# Altium footprint library 769BI_LTDC.PcbLib: 51 footprints (part 1 of 4)
Each footprint in its own frame and in the unit in brackets; x right, y up, seen from the top. Pads: shape width x height; smd on the part's side, far side on the other; paste and mask are expansions set on the pad; w line width, h text height; cw(c..) or ccw(c..) is an arc to the next point about the centre after c.
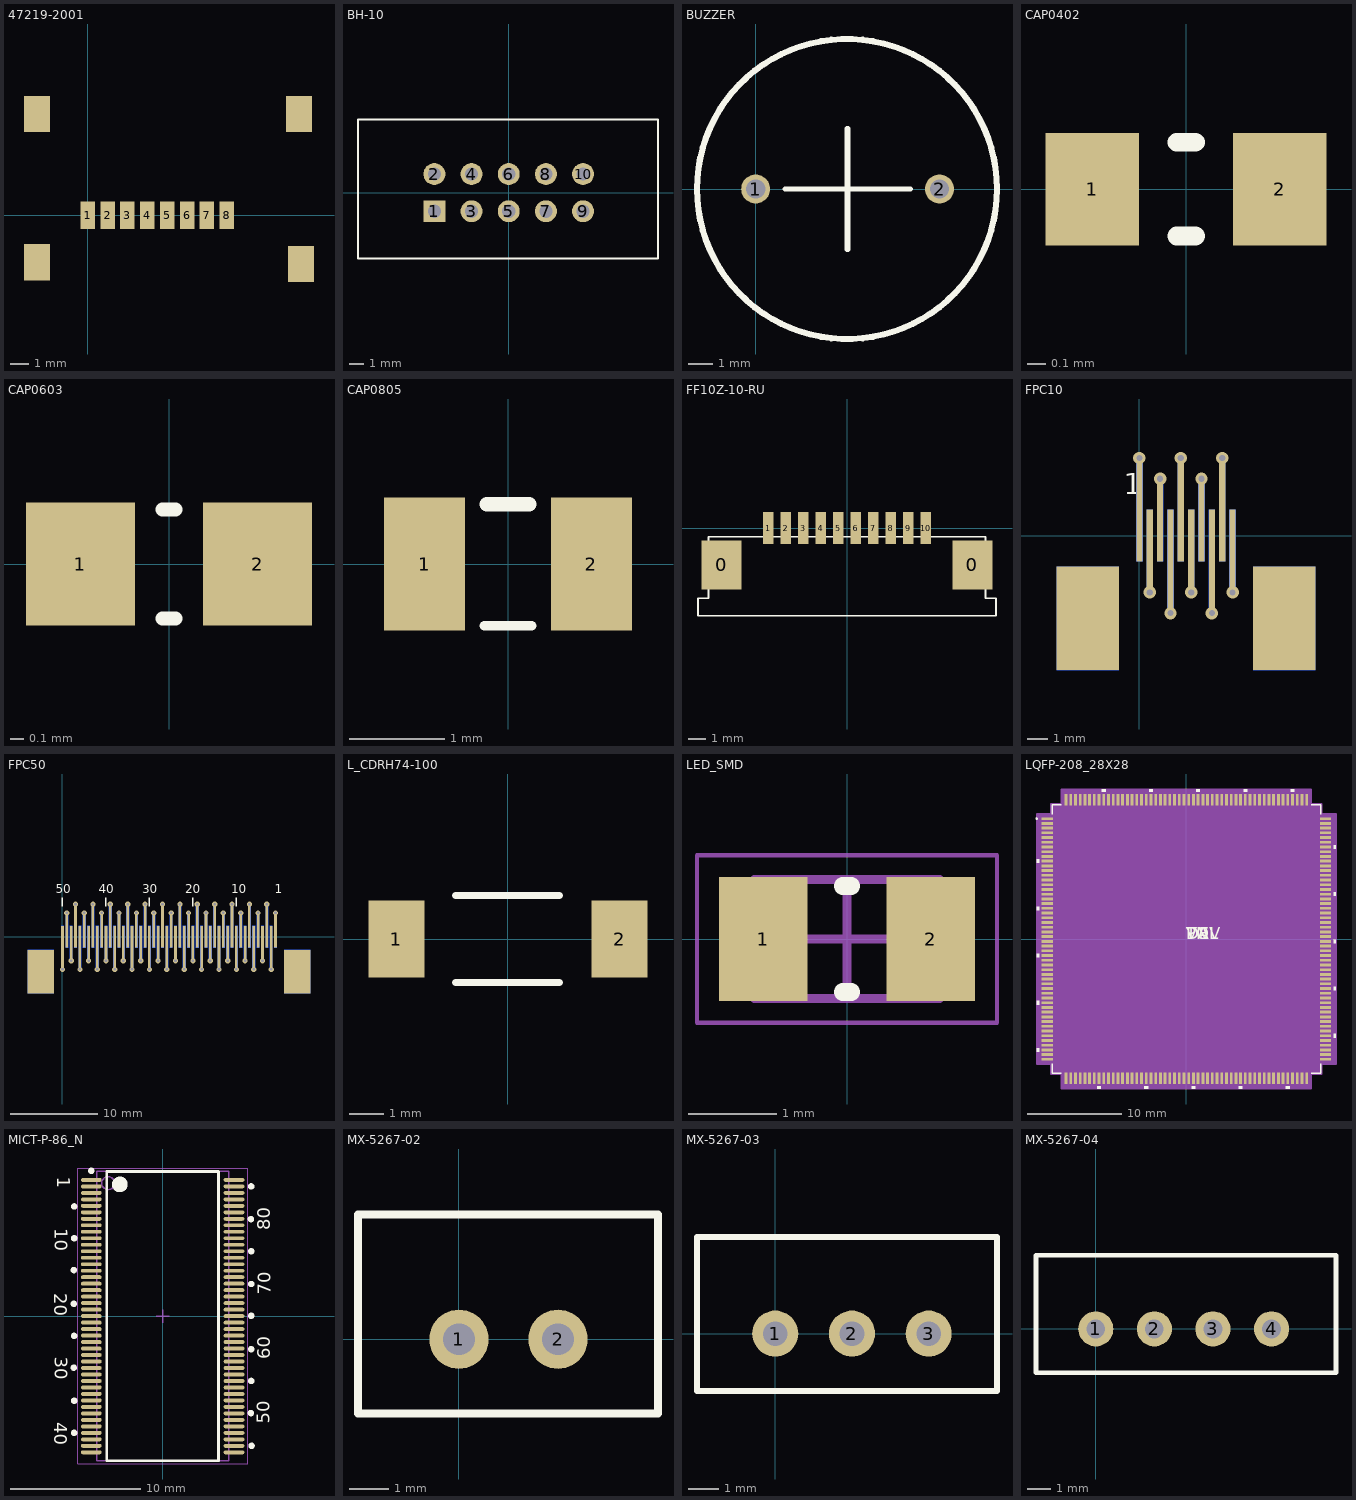
[diagram p0: the footprints below, top view; thin cyan lines are the x and y axes]

## 47219-2001 [mm]
pads (12):
  rect 0.8x1.5 smd: 1(0,0) 2(1.1,0) 3(2.2,0) 4(3.3,0) 5(4.4,0) 6(5.5,0) 7(6.6,0) 8(7.7,0)
  rect 1.45x2 smd: ""(-2.8,-2.6) ""(-2.8,5.6) ""(11.7,5.6) ""(11.8,-2.7)
3D body "472192001.stp": height 2.06, standoff 0.17, extent -2.8,-5.15 11.8,9.35

## BH-10 [mm]
pads (10):
  rect 1.5x1.5 hole 0.9: 1(-5.08,-1.27)
  round 1.5 hole 0.9: 2(-5.08,1.27) 3(-2.54,-1.27) 4(-2.54,1.27) 5(0,-1.27) 6(0,1.27) 7(2.54,-1.27) 8(2.54,1.27) 9(5.08,-1.27) 10(5.08,1.27)
Top Overlay:
  lines w0.127: -10.3,-4.5 -10.3,5 10.2,5 10.2,-4.5 -10.3,-4.5
3D body "BH-10.STEP": height 9.1, standoff -3, extent -10.25,-4.4 10.25,4.9

## BUZZER [mm]
pads (2):
  round 1.2 hole 0.8: 1(0,0) 2(7.6,0)
Top Overlay:
  circle w0.254: c3.775,0 r6.2
  lines w0.2: 1.2,0 3.775,0 ; 3.825,0 6.4,0 ; 3.775,0 3.775,-2.5 3.825,-2.5 3.825,2.5 3.775,2.5 3.775,0
3D body "buzzer.STEP": height 9.5, standoff -5.5, extent -2.317,-6 9.683,6

## CAP0402 [mm] "Capacitor 0402 reflow soldering"
pads (2):
  rect 0.5x0.6 smd: 1(-0.5,0) 2(0.5,0)
Top Overlay:
  lines w0.1: -0.05,-0.25 0.05,-0.25 ; -0.05,0.25 0.05,0.25
3D body "CAP0402.stp": height 0.2, standoff 0, extent -0.5,-0.3 0.5,0.3

## CAP0603 [mm] "capacitor 0603 reflow soldering"
pads (2):
  rect 0.8x0.9 smd: 1(-0.65,0) 2(0.65,0)
Top Overlay:
  lines w0.1: -0.05,-0.4 0.05,-0.4 ; -0.05,0.4 0.05,0.4
3D body "CAP0603.stp": height 0.3, standoff 0, extent -0.8,-0.4 0.8,0.4

## CAP0805 [mm] "capacitor 0805 reflow soldering"
pads (2):
  rect 0.85x1.4 smd: 1(-0.875,0) 2(0.875,0)
Top Overlay:
  lines w0.1: -0.25,-0.65 0.25,-0.65
  lines w0.152: -0.225,0.625 0.225,0.625
3D body "CAP0805.stp": height 0.78, standoff 0, extent -1,-0.625 1,0.625

## FF10Z-10-RU [mm]
pads (12):
  rect 2.3x2.8 smd: 0(-7.15,-2.1) 0(7.15,-2.1)
  rect 0.6x1.8 smd: 1(-4.5,0) 2(-3.5,0) 3(-2.5,0) 4(-1.5,0) 5(-0.5,0) 6(0.5,0) 7(1.5,0) 8(2.5,0) 9(3.5,0) 10(4.5,0)
Top Overlay:
  lines w0.1: -8.5,-5 -8.5,-4 -7.9,-4 -7.9,-0.5 7.9,-0.5 7.9,-4 8.5,-4 8.5,-5 -8.5,-5

## FPC10 [mm]
pads (24):
  rect 0.3x5 smd: 1(0,1.25) 4(1.5,-1.25) 5(2,1.25) 8(3.5,-1.25) 9(4,1.25)
  rect 0.3x5 smd far side: 1(0,1.25) 4(1.5,-1.25) 5(2,1.25) 8(3.5,-1.25) 9(4,1.25)
  rect 0.3x4 smd: 2(0.5,-0.75) 3(1,0.75) 6(2.5,-0.75) 7(3,0.75) 10(4.5,-0.75)
  rect 0.3x4 smd far side: 2(0.5,-0.75) 3(1,0.75) 6(2.5,-0.75) 7(3,0.75) 10(4.5,-0.75)
  rect 3x5 smd: ""(-2.5,-4) ""(7,-4)
  rect 3x5 smd far side: ""(-2.5,-4) ""(7,-4)
via 2.5,-2.75 diameter 0.6 hole 0.3
via 3,2.75 diameter 0.6 hole 0.3
via 4.5,-2.75 diameter 0.6 hole 0.3
via 4,3.75 diameter 0.6 hole 0.3
via 1.5,-3.75 diameter 0.6 hole 0.3
via 3.5,-3.75 diameter 0.6 hole 0.3
via 2,3.75 diameter 0.6 hole 0.3
via 1,2.75 diameter 0.6 hole 0.3
via 0,3.75 diameter 0.6 hole 0.3
via 0.5,-2.75 diameter 0.6 hole 0.3
Top Layer:
  lines w0.3: 2,3.75 2,3.75 ; 3.5,-3.75 3.5,-3.75 ; 4,3.75 4,3.75
Top Overlay:
  text "1" at -0.75,2 h1
3D body "FPC_10.SLDPRT": height 1, standoff -1.05, extent -2.715,-6.51 7.715,-1.4

## FPC50 [mm]
pads (104):
  rect 0.3x4 smd: 1(24.5,0.75) 4(23,-0.75) 5(22.5,0.75) 8(21,-0.75) 9(20.5,0.75) 12(19,-0.75) 13(18.5,0.75) 16(17,-0.75) 17(16.5,0.75) 20(15,-0.75) 21(14.5,0.75) 24(13,-0.75) 25(12.5,0.75) 28(11,-0.75) 29(10.5,0.75) 32(9,-0.75) 33(8.5,0.75) 36(7,-0.75) 37(6.5,0.75) 40(5,-0.75) 41(4.5,0.75) 44(3,-0.75) 45(2.5,0.75) 48(1,-0.75) 49(0.5,0.75)
  rect 0.3x4 smd far side: 1(24.5,0.75) 4(23,-0.75) 5(22.5,0.75) 8(21,-0.75) 9(20.5,0.75) 12(19,-0.75) 13(18.5,0.75) 16(17,-0.75) 17(16.5,0.75) 20(15,-0.75) 21(14.5,0.75) 24(13,-0.75) 25(12.5,0.75) 28(11,-0.75) 29(10.5,0.75) 32(9,-0.75) 33(8.5,0.75) 36(7,-0.75) 37(6.5,0.75) 40(5,-0.75) 41(4.5,0.75) 44(3,-0.75) 45(2.5,0.75) 48(1,-0.75) 49(0.5,0.75)
  rect 0.3x5 smd: 2(24,-1.25) 3(23.5,1.25) 6(22,-1.25) 7(21.5,1.25) 10(20,-1.25) 11(19.5,1.25) 14(18,-1.25) 15(17.5,1.25) 18(16,-1.25) 19(15.5,1.25) 22(14,-1.25) 23(13.5,1.25) 26(12,-1.25) 27(11.5,1.25) 30(10,-1.25) 31(9.5,1.25) 34(8,-1.25) 35(7.5,1.25) 38(6,-1.25) 39(5.5,1.25) 42(4,-1.25) 43(3.5,1.25) 46(2,-1.25) 47(1.5,1.25) 50(0,-1.25)
  rect 0.3x5 smd far side: 2(24,-1.25) 3(23.5,1.25) 6(22,-1.25) 7(21.5,1.25) 10(20,-1.25) 11(19.5,1.25) 14(18,-1.25) 15(17.5,1.25) 18(16,-1.25) 19(15.5,1.25) 22(14,-1.25) 23(13.5,1.25) 26(12,-1.25) 27(11.5,1.25) 30(10,-1.25) 31(9.5,1.25) 34(8,-1.25) 35(7.5,1.25) 38(6,-1.25) 39(5.5,1.25) 42(4,-1.25) 43(3.5,1.25) 46(2,-1.25) 47(1.5,1.25) 50(0,-1.25)
  rect 3x5 smd: ""(-2.5,-4) ""(27,-4)
  rect 3x5 smd far side: ""(-2.5,-4) ""(27,-4)
via 0.5,2.75 diameter 0.6 hole 0.3
via 2.5,2.75 diameter 0.6 hole 0.3
via 4.5,2.75 diameter 0.6 hole 0.3
via 23.5,3.75 diameter 0.6 hole 0.3
via 24,-3.75 diameter 0.6 hole 0.3
via 24.5,2.75 diameter 0.6 hole 0.3
via 21.5,3.75 diameter 0.6 hole 0.3
via 19.5,3.75 diameter 0.6 hole 0.3
via 17.5,3.75 diameter 0.6 hole 0.3
via 15.5,3.75 diameter 0.6 hole 0.3
via 13.5,3.75 diameter 0.6 hole 0.3
via 11.5,3.75 diameter 0.6 hole 0.3
via 9.5,3.75 diameter 0.6 hole 0.3
via 7.5,3.75 diameter 0.6 hole 0.3
via 5.5,3.75 diameter 0.6 hole 0.3
via 3.5,3.75 diameter 0.6 hole 0.3
via 1.5,3.75 diameter 0.6 hole 0.3
via 22,-3.75 diameter 0.6 hole 0.3
via 20,-3.75 diameter 0.6 hole 0.3
via 18,-3.75 diameter 0.6 hole 0.3
via 16,-3.75 diameter 0.6 hole 0.3
via 14,-3.75 diameter 0.6 hole 0.3
via 12,-3.75 diameter 0.6 hole 0.3
via 10,-3.75 diameter 0.6 hole 0.3
via 8,-3.75 diameter 0.6 hole 0.3
via 6,-3.75 diameter 0.6 hole 0.3
via 4,-3.75 diameter 0.6 hole 0.3
via 2,-3.75 diameter 0.6 hole 0.3
via 0,-3.75 diameter 0.6 hole 0.3
via 23,-2.75 diameter 0.6 hole 0.3
via 22.5,2.75 diameter 0.6 hole 0.3
via 20.5,2.75 diameter 0.6 hole 0.3
via 18.5,2.75 diameter 0.6 hole 0.3
via 16.5,2.75 diameter 0.6 hole 0.3
via 14.5,2.75 diameter 0.6 hole 0.3
via 12.5,2.75 diameter 0.6 hole 0.3
via 10.5,2.75 diameter 0.6 hole 0.3
via 8.5,2.75 diameter 0.6 hole 0.3
via 6.5,2.75 diameter 0.6 hole 0.3
via 21,-2.75 diameter 0.6 hole 0.3
via 19,-2.75 diameter 0.6 hole 0.3
via 17,-2.75 diameter 0.6 hole 0.3
via 15,-2.75 diameter 0.6 hole 0.3
via 13,-2.75 diameter 0.6 hole 0.3
via 11,-2.75 diameter 0.6 hole 0.3
via 9,-2.75 diameter 0.6 hole 0.3
via 7,-2.75 diameter 0.6 hole 0.3
via 5,-2.75 diameter 0.6 hole 0.3
via 3,-2.75 diameter 0.6 hole 0.3
via 1,-2.75 diameter 0.6 hole 0.3
Top Layer:
  lines w0.3: 6,-3.75 6,-3.75
Bottom Layer:
  lines w0.3: 1,-2.5 1,-2.5 ; 3,-2.5 3,-2.5 ; 5,-2.5 5,-2.5 ; 7,-2.5 7,-2.5 ; 1.5,3.75 1.5,3.75 ; 3.5,3.75 3.5,3.75 ; 11.5,3.75 11.5,3.75
Top Overlay:
  lines w0.15: 0,3.5 0,4.5 ; 5,3.5 5,4.5 ; 10,3.5 10,4.5 ; 15,3.5 15,4.5 ; 20,3.5 20,4.5
  text "1" at 24.4,5 h1
  text "10" at 19.4,5 h1
  text "20" at 14.1,5 h1
  text "30" at 9.2,5 h1
  text "40" at 4.2,5 h1
  text "50" at -0.8,5 h1
3D body "FFC50.stp": height 0.05, standoff -2, extent -2.55,-7.425 27.95,-0.275
3D body "FFC50.stp": height 2, standoff -0.05, extent -2.525,-7.35 27.975,-0.2

## L_CDRH74-100 [mm]
pads (2):
  rect 1.6x2.2 smd: 1(-3.2,0) 2(3.2,0)
Top Overlay:
  lines w0.2: -1.5,-1.25 1.475,-1.25 ; -1.5,1.25 1.475,1.25
3D body "CDRN74.stp": height 4.39, standoff -0.11, extent -3.65,-3.65 3.65,3.65

## LED_SMD [mm] "Chip Diode, 2-Leads, Body 2,00x1,25mm, IPC Medium Density"
height 0.85
pads (2):
  rect 1x1.4 smd: 1(-0.95,0) 2(0.95,0)
Top Overlay:
  lines w0.2: -0.05,-0.6 0.05,-0.6 ; -0.05,0.6 0.05,0.6
Mechanical 13:
  lines w0.1: -1.05,-0.675 1.05,-0.675 1.05,0.675 -1.05,0.675 -1.05,-0.675
Mechanical 15:
  lines w0.05: -1.7,-0.95 1.7,-0.95 1.7,0.95 -1.7,0.95 -1.7,-0.95
  lines w0.1: -0.5,0 0.5,0 ; 0,-0.5 0,0.5
3D body "APT2012.STEP": height 0.74, standoff -0.01, extent -1,-0.625 1,0.625

## LQFP-208_28X28 [mm]
pads (208):
  rect 1.2x0.3 smd: 1(-14.75,12.75) 2(-14.75,12.25) 3(-14.75,11.75) 4(-14.75,11.25) 5(-14.75,10.75) 6(-14.75,10.25) 7(-14.75,9.75) 8(-14.75,9.25) 9(-14.75,8.75) 10(-14.75,8.25) 11(-14.75,7.75) 12(-14.75,7.25) 13(-14.75,6.75) 14(-14.75,6.25) 15(-14.75,5.75) 16(-14.75,5.25) 17(-14.75,4.75) 18(-14.75,4.25) 19(-14.75,3.75) 20(-14.75,3.25) 21(-14.75,2.75) 22(-14.75,2.25) 23(-14.75,1.75) 24(-14.75,1.25) 25(-14.75,0.75) 26(-14.75,0.25) 27(-14.75,-0.25) 28(-14.75,-0.75) 29(-14.75,-1.25) 30(-14.75,-1.75) 31(-14.75,-2.25) 32(-14.75,-2.75) 33(-14.75,-3.25) 34(-14.75,-3.75) 35(-14.75,-4.25) 36(-14.75,-4.75) 37(-14.75,-5.25) 38(-14.75,-5.75) 39(-14.75,-6.25) 40(-14.75,-6.75) 41(-14.75,-7.25) 42(-14.75,-7.75) 43(-14.75,-8.25) 44(-14.75,-8.75) 45(-14.75,-9.25) 46(-14.75,-9.75) 47(-14.75,-10.25) 48(-14.75,-10.75) 49(-14.75,-11.25) 50(-14.75,-11.75) 51(-14.75,-12.25) 52(-14.75,-12.75) 105(14.75,-12.75) 106(14.75,-12.25) 107(14.75,-11.75) 108(14.75,-11.25) 109(14.75,-10.75) 110(14.75,-10.25) 111(14.75,-9.75) 112(14.75,-9.25) 113(14.75,-8.75) 114(14.75,-8.25) 115(14.75,-7.75) 116(14.75,-7.25) 117(14.75,-6.75) 118(14.75,-6.25) 119(14.75,-5.75) 120(14.75,-5.25) 121(14.75,-4.75) 122(14.75,-4.25) 123(14.75,-3.75) 124(14.75,-3.25) 125(14.75,-2.75) 126(14.75,-2.25) 127(14.75,-1.75) 128(14.75,-1.25) 129(14.75,-0.75) 130(14.75,-0.25) 131(14.75,0.25) 132(14.75,0.75) 133(14.75,1.25) 134(14.75,1.75) 135(14.75,2.25) 136(14.75,2.75) 137(14.75,3.25) 138(14.75,3.75) 139(14.75,4.25) 140(14.75,4.75) 141(14.75,5.25) 142(14.75,5.75) 143(14.75,6.25) 144(14.75,6.75) 145(14.75,7.25) 146(14.75,7.75) 147(14.75,8.25) 148(14.75,8.75) 149(14.75,9.25) 150(14.75,9.75) 151(14.75,10.25) 152(14.75,10.75) 153(14.75,11.25) 154(14.75,11.75) 155(14.75,12.25) 156(14.75,12.75)
  rect 0.3x1.2 smd: 53(-12.75,-14.75) 54(-12.25,-14.75) 55(-11.75,-14.75) 56(-11.25,-14.75) 57(-10.75,-14.75) 58(-10.25,-14.75) 59(-9.75,-14.75) 60(-9.25,-14.75) 61(-8.75,-14.75) 62(-8.25,-14.75) 63(-7.75,-14.75) 64(-7.25,-14.75) 65(-6.75,-14.75) 66(-6.25,-14.75) 67(-5.75,-14.75) 68(-5.25,-14.75) 69(-4.75,-14.75) 70(-4.25,-14.75) 71(-3.75,-14.75) 72(-3.25,-14.75) 73(-2.75,-14.75) 74(-2.25,-14.75) 75(-1.75,-14.75) 76(-1.25,-14.75) 77(-0.75,-14.75) 78(-0.25,-14.75) 79(0.25,-14.75) 80(0.75,-14.75) 81(1.25,-14.75) 82(1.75,-14.75) 83(2.25,-14.75) 84(2.75,-14.75) 85(3.25,-14.75) 86(3.75,-14.75) 87(4.25,-14.75) 88(4.75,-14.75) 89(5.25,-14.75) 90(5.75,-14.75) 91(6.25,-14.75) 92(6.75,-14.75) 93(7.25,-14.75) 94(7.75,-14.75) 95(8.25,-14.75) 96(8.75,-14.75) 97(9.25,-14.75) 98(9.75,-14.75) 99(10.25,-14.75) 100(10.75,-14.75) 101(11.25,-14.75) 102(11.75,-14.75) 103(12.25,-14.75) 104(12.75,-14.75) 157(12.75,14.75) 158(12.25,14.75) 159(11.75,14.75) 160(11.25,14.75) 161(10.75,14.75) 162(10.25,14.75) 163(9.75,14.75) 164(9.25,14.75) 165(8.75,14.75) 166(8.25,14.75) 167(7.75,14.75) 168(7.25,14.75) 169(6.75,14.75) 170(6.25,14.75) 171(5.75,14.75) 172(5.25,14.75) 173(4.75,14.75) 174(4.25,14.75) 175(3.75,14.75) 176(3.25,14.75) 177(2.75,14.75) 178(2.25,14.75) 179(1.75,14.75) 180(1.25,14.75) 181(0.75,14.75) 182(0.25,14.75) 183(-0.25,14.75) 184(-0.75,14.75) 185(-1.25,14.75) 186(-1.75,14.75) 187(-2.25,14.75) 188(-2.75,14.75) 189(-3.25,14.75) 190(-3.75,14.75) 191(-4.25,14.75) 192(-4.75,14.75) 193(-5.25,14.75) 194(-5.75,14.75) 195(-6.25,14.75) 196(-6.75,14.75) 197(-7.25,14.75) 198(-7.75,14.75) 199(-8.25,14.75) 200(-8.75,14.75) 201(-9.25,14.75) 202(-9.75,14.75) 203(-10.25,14.75) 204(-10.75,14.75) 205(-11.25,14.75) 206(-11.75,14.75) 207(-12.25,14.75) 208(-12.75,14.75)
Top Overlay:
  circle w0.152: c-15.854,12.75 r0.076
  region: -8.56,15.604 -8.941,15.604 -8.941,15.858 -8.56,15.858
  region: -3.56,15.604 -3.941,15.604 -3.941,15.858 -3.56,15.858
  region: 1.441,15.604 1.06,15.604 1.06,15.858 1.441,15.858
  region: 6.441,15.604 6.06,15.604 6.06,15.858 6.441,15.858
  region: 11.441,15.604 11.06,15.604 11.06,15.858 11.441,15.858
  region: 15.604,9.941 15.858,9.941 15.858,9.56 15.604,9.56
  region: 15.604,4.941 15.858,4.941 15.858,4.56 15.604,4.56
  region: 15.604,-0.059 15.858,-0.059 15.858,-0.44 15.604,-0.44
  region: 15.604,-5.059 15.858,-5.059 15.858,-5.44 15.604,-5.44
  region: 15.604,-10.059 15.858,-10.059 15.858,-10.44 15.604,-10.44
  region: 10.941,-15.604 10.56,-15.604 10.56,-15.858 10.941,-15.858
  region: 5.941,-15.604 5.56,-15.604 5.56,-15.858 5.941,-15.858
  region: 0.941,-15.604 0.56,-15.604 0.56,-15.858 0.941,-15.858
  region: -4.059,-15.604 -4.44,-15.604 -4.44,-15.858 -4.059,-15.858
  region: -9.059,-15.604 -9.44,-15.604 -9.44,-15.858 -9.059,-15.858
  region: -15.604,-11.559 -15.858,-11.559 -15.858,-11.94 -15.604,-11.94
  region: -15.604,-6.559 -15.858,-6.559 -15.858,-6.94 -15.604,-6.94
  region: -15.604,-1.559 -15.858,-1.559 -15.858,-1.94 -15.604,-1.94
  region: -15.604,3.441 -15.858,3.441 -15.858,3.06 -15.604,3.06
  region: -15.604,8.441 -15.858,8.441 -15.858,8.06 -15.604,8.06
  lines w0.152: -14.227,-13.233 -14.227,-14.227 -13.233,-14.227 ; -14.227,13.233 -14.227,14.227 -13.233,14.227 ; 13.233,-14.227 14.227,-14.227 14.227,-13.233 ; 13.233,14.227 14.227,14.227 14.227,13.233
  text "TOL" at 0,0 h1.27
  text "VAL" at 0,0 h1.27
  text "DEV" at 0,0 h1.27
  text "PN" at 0,0 h1.27
Mechanical 13:
  circle w0: c-13.515,12.75 r0.076
  text "RefDes2" at 0,0 h1.27
Mechanical 15:
  region: -13.258,-14.354 -14.354,-14.354 -14.354,-13.258 -15.858,-13.258 -15.858,13.258 -14.354,13.258 -14.354,14.354 -13.258,14.354 -13.258,15.858 13.258,15.858 13.258,14.354 14.354,14.354 14.354,13.258 15.858,13.258 15.858,-13.258 14.354,-13.258 14.354,-14.354 13.258,-14.354 13.258,-15.858 -13.258,-15.858
  lines w0.152: -15.858,-13.258 -15.858,13.258 -14.354,13.258 -14.354,14.354 -13.258,14.354 -13.258,15.858 13.258,15.858 13.258,14.354 14.354,14.354 14.354,13.258 15.858,13.258 15.858,-13.258 14.354,-13.258 14.354,-14.354 13.258,-14.354 13.258,-15.858 -13.258,-15.858 -13.258,-14.354 -14.354,-14.354 -14.354,-13.258 -15.858,-13.258
Multi-Layer:
  text "Copyright (C) 2016 Accelerated Designs. All rights reserved" at 0,0 h0.03
3D body: height 0.25, standoff 0, extent 0,0 0.254,0.254

## MICT-P-86_N [mm] "SOP, 86-Leads, Body 22.22x10.6mm, Pitch 0.5mm, , IPC Medium Density"
height 1.2
pads (86):
  oval 1.6x0.3 smd: 1(-5.5,10.5) 2(-5.5,10) 3(-5.5,9.5) 4(-5.5,9) 5(-5.5,8.5) 6(-5.5,8) 7(-5.5,7.5) 8(-5.5,7) 9(-5.5,6.5) 10(-5.5,6) 11(-5.5,5.5) 12(-5.5,5) 13(-5.5,4.5) 14(-5.5,4) 15(-5.5,3.5) 16(-5.5,3) 17(-5.5,2.5) 18(-5.5,2) 19(-5.5,1.5) 20(-5.5,1) 21(-5.5,0.5) 22(-5.5,0) 23(-5.5,-0.5) 24(-5.5,-1) 25(-5.5,-1.5) 26(-5.5,-2) 27(-5.5,-2.5) 28(-5.5,-3) 29(-5.5,-3.5) 30(-5.5,-4) 31(-5.5,-4.5) 32(-5.5,-5) 33(-5.5,-5.5) 34(-5.5,-6) 35(-5.5,-6.5) 36(-5.5,-7) 37(-5.5,-7.5) 38(-5.5,-8) 39(-5.5,-8.5) 40(-5.5,-9) 41(-5.5,-9.5) 42(-5.5,-10) 43(-5.5,-10.5) 44(5.5,-10.5) 45(5.5,-10) 46(5.5,-9.5) 47(5.5,-9) 48(5.5,-8.5) 49(5.5,-8) 50(5.5,-7.5) 51(5.5,-7) 52(5.5,-6.5) 53(5.5,-6) 54(5.5,-5.5) 55(5.5,-5) 56(5.5,-4.5) 57(5.5,-4) 58(5.5,-3.5) 59(5.5,-3) 60(5.5,-2.5) 61(5.5,-2) 62(5.5,-1.5) 63(5.5,-1) 64(5.5,-0.5) 65(5.5,0) 66(5.5,0.5) 67(5.5,1) 68(5.5,1.5) 69(5.5,2) 70(5.5,2.5) 71(5.5,3) 72(5.5,3.5) 73(5.5,4) 74(5.5,4.5) 75(5.5,5) 76(5.5,5.5) 77(5.5,6) 78(5.5,6.5) 79(5.5,7) 80(5.5,7.5) 81(5.5,8) 82(5.5,8.5) 83(5.5,9) 84(5.5,9.5) 85(5.5,10) 86(5.5,10.5)
Top Overlay:
  circle w0.25: c-6.825,8.45 r0.125
  circle w0.25: c-5.5,11.2 r0.125
  circle w0.6: c-3.3,10.15 r0.3
  circle w0.25: c-6.825,6 r0.125
  circle w0.25: c-6.85,3.55 r0.125
  circle w0.25: c-6.85,0.95 r0.125
  circle w0.25: c-6.825,-1.525 r0.125
  circle w0.25: c-6.85,-3.975 r0.125
  circle w0.25: c-6.825,-6.525 r0.125
  circle w0.25: c-6.825,-9 r0.125
  circle w0.25: c6.85,-10 r0.125
  circle w0.25: c6.8,-7.475 r0.125
  circle w0.25: c6.825,-5 r0.125
  circle w0.25: c6.825,-2.55 r0.125
  circle w0.25: c6.825,0.025 r0.125
  circle w0.25: c6.825,2.475 r0.125
  circle w0.25: c6.825,5 r0.125
  circle w0.25: c6.8,7.475 r0.125
  circle w0.25: c6.825,10 r0.125
  lines w0.2: -4.3,-11.15 -4.3,11.15 4.3,11.15 4.3,-11.15 -4.3,-11.15
  text "1" at -8.125,10.725 h1
  text "10" at -8.3,6.775 h1
  text "20" at -8.35,1.75 h1
  text "30" at -8.325,-3.15 h1
  text "40" at -8.35,-8.2 h1
  text "50" at 8.25,-8.3 h1
  text "60" at 8.3,-3.325 h1
  text "70" at 8.325,1.65 h1
  text "80" at 8.3,6.6 h1
Mechanical 13:
  circle w0.1: c-4.2,10.25 r0.5
  lines w0.1: -5.1,-11.15 -5.1,11.15 5.1,11.15 5.1,-11.15 -5.1,-11.15
Mechanical 15:
  lines w0.05: -6.55,-11.4 -6.55,11.4 6.55,11.4 6.55,-11.4 -6.55,-11.4
  lines w0.1: -0.5,0 0.5,0 ; 0,-0.5 0,0.5
3D body: height 1.2, standoff 0.05, extent -5.1,-11.15 5.1,11.15
3D body "User Library-TSOP-86.STEP": height 1.16, standoff 0.07, extent -5.945,-10.994 5.845,11

## MX-5267-02 [mm]
pads (2):
  round 1.5 hole 0.8: 1(0,0) 2(2.5,0)
Top Overlay:
  lines w0.2: -2.55,-1.875 -2.55,3.15 5.025,3.15 5.025,-1.875 -2.55,-1.875
3D body "022035025.stp": height 6.95, standoff -2.45, extent -2.425,-1.805 4.975,3.095

## MX-5267-03 [mm]
pads (3):
  round 1.5 hole 0.8: 1(0,0) 2(2.5,0) 3(5,0)
Top Overlay:
  lines w0.2: -2.55,-1.875 -2.55,3.15 7.225,3.15 7.225,-1.875 -2.55,-1.875
3D body "022035035.stp": height 6.95, standoff -2.45, extent -2.525,-1.855 7.375,3.045

## MX-5267-04 [mm]
pads (4):
  round 1.5 hole 0.8: 1(0,0) 2(2.5,0) 3(5,0) 4(7.5,0)
Top Overlay:
  lines w0.2: -2.55,-1.875 10.25,-1.875 10.25,3.15 -2.55,3.15 -2.55,-1.875
3D body "022035045.stp": height 6.95, standoff -2.45, extent -2.35,-1.78 10.05,3.12